# Altium footprint library PcbLib1.PcbLib: 1016 footprints (part 28 of 64)
Each footprint in its own frame and in the unit in brackets; x right, y up, seen from the top. Pads: shape width x height; smd on the part's side, far side on the other; paste and mask are expansions set on the pad; w line width, h text height; cw(c..) or ccw(c..) is an arc to the next point about the centre after c.
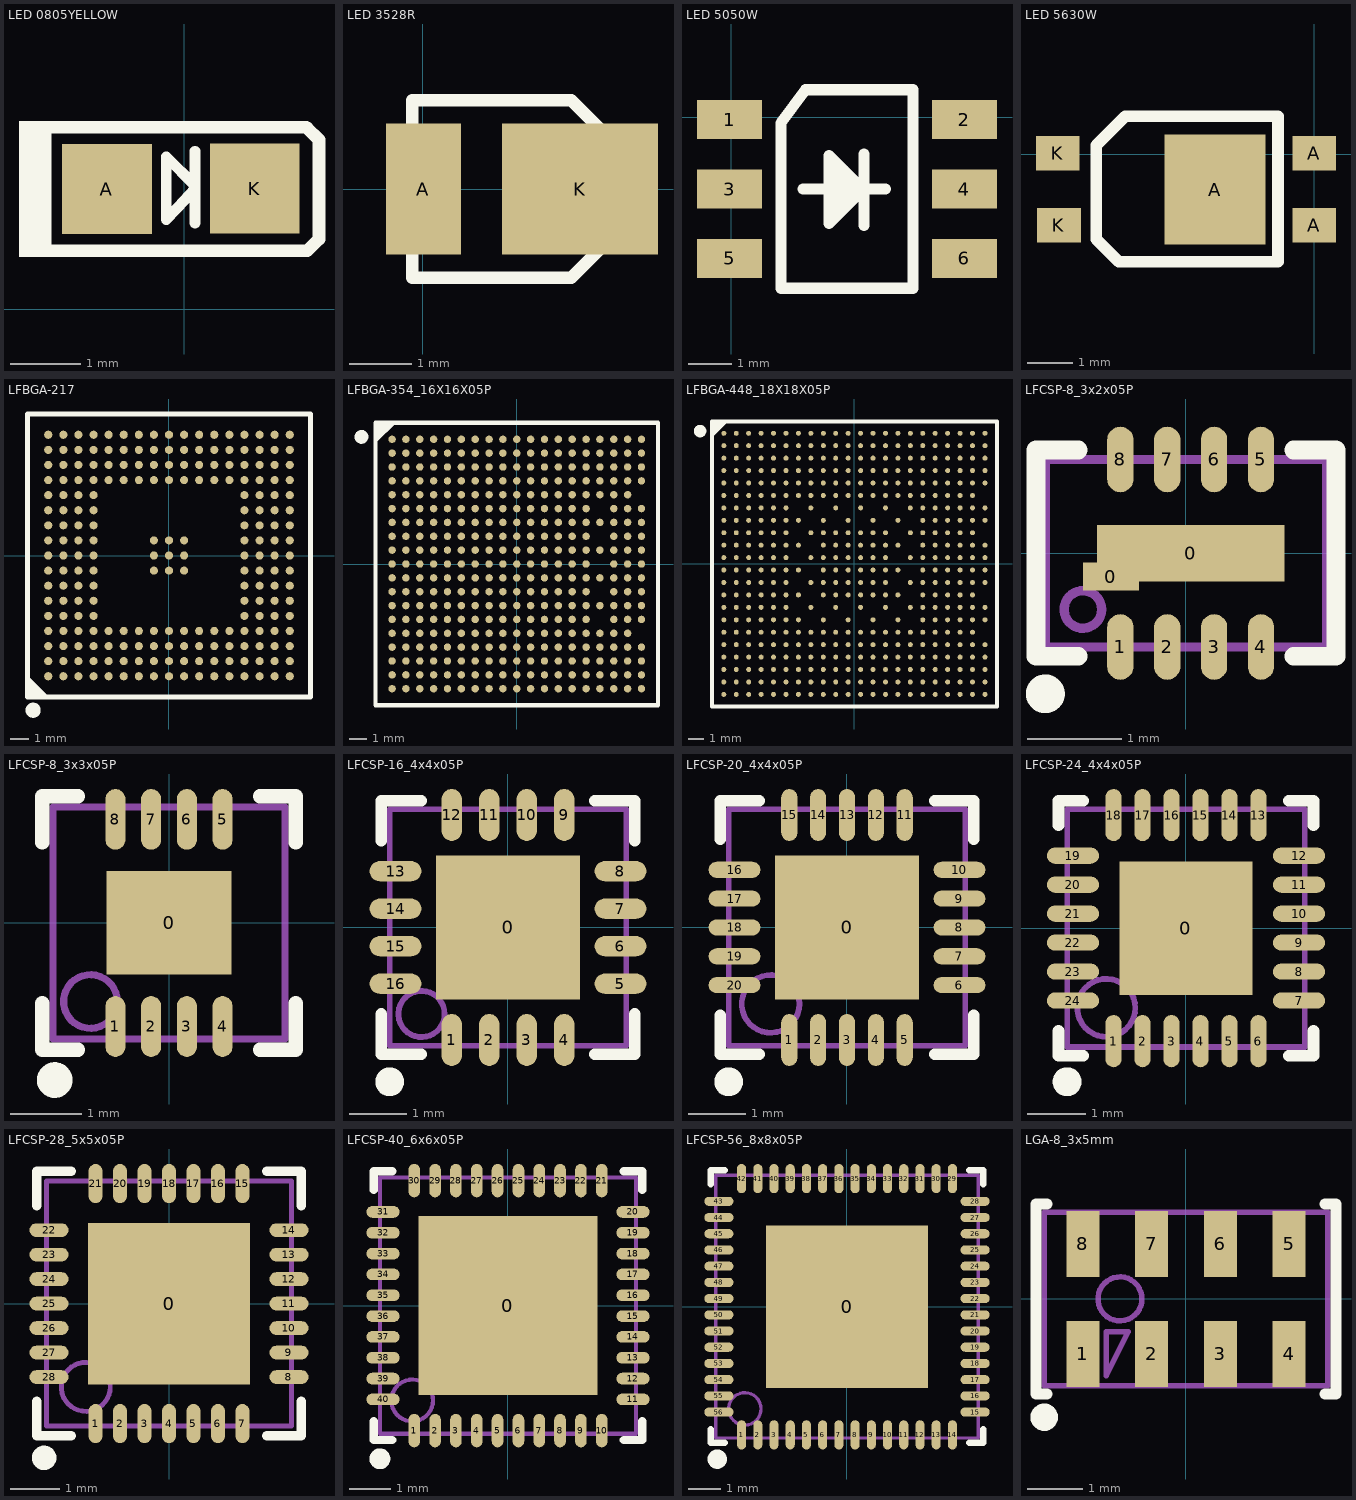
[diagram p27: the footprints below, top view; thin cyan lines are the x and y axes]

## LED 0805YELLOW [mil]
pads (2):
  rect 50x50 smd: A(-43,67) K(39.3,67.2)
Top Overlay:
  rectangle: -92,29 -74,105
  lines w6: 6,48 6,88 ; 6,67 -10,50 -10,85 6,69
  lines w7: -86,101.5 67.98,101.5 68.48,101 75.06,94.42 75.06,39.06 68.5,32.5 -81,32.5
  lines w8: -78.06,44.56 -78.06,88
3D body: height 15, standoff 0, extent 20.15,46.07 36.88,87.93
3D body: height 15, standoff 0, extent -42.41,45.96 -25.68,88.04
3D body: height 15, standoff 0, extent -25.75,46 20.31,88
3D body: height 18, standoff 0, extent -17.85,48.72 13.4,82.81
3D body: height 18, standoff 0, extent -16.53,55 4.53,77

## LED 3528R [mm]
pads (2):
  rect 1.2x2.1 smd: A(0.013,0)
  rect 2.5x2.1 smd: K(2.527,0)
Top Overlay:
  lines w0.2: -0.165,-1.422 2.388,-1.422 3.34,-0.47 3.34,0.47 2.388,1.422 -0.165,1.422 -0.165,-1.422
3D body "3.STEP": height 1.95, standoff 0.05, extent -0.254,-1.4 3.246,1.4

## LED 5050W [mm]
pads (6):
  rect 1.5x0.9 smd: 1(-0.038,-0.051) 2(5.372,-0.051) 3(-0.038,-1.651) 4(5.372,-1.651) 5(-0.038,-3.251) 6(5.372,-3.251)
Top Overlay:
  lines w0.254: 1.651,-1.651 3.556,-1.651 ; 2.413,-1.092 2.438,-2.083 2.921,-1.651 2.667,-1.397 2.667,-1.651 2.667,-1.905 ; 3.023,-1.671 2.25,-2.443 2.25,-0.876 3.063,-1.689 ; 3.063,-2.492 3.063,-0.846 ; 1.143,-3.937 4.191,-3.937 4.191,0.635 1.714,0.635 1.143,-0.127 1.143,-3.937
Mechanical 15:
  circle w0.05: c2.667,-1.651 r0.35
  lines w0.05: 2.167,-1.651 3.167,-1.651 ; 2.667,-2.151 2.667,-1.151
3D body "2.STEP": height 1.65, standoff 0.05, extent -0.033,-4.111 5.367,0.889

## LED 5630W [mm]
pads (5):
  rect 2.2x2.4 smd: A(-2.159,-0.768)
  rect 0.95x0.75 smd: A(0,-1.543) A(0,0.019) K(-5.588,0.019) K(-5.563,-1.543)
Top Overlay:
  lines w0.254: -4.75,-1.854 -4.75,0.197 -4.115,0.832 -0.787,0.832 -0.787,-2.343 -4.261,-2.343 -4.75,-1.854
3D body "1.STEP": height 0.95, standoff 0.05, extent -5.567,-2.286 0.233,0.714

## LFBGA-217 [mm]
pads (217):
  round 0.43 smd mask+0.051: A1(-6.4,-6.4) A2(-6.4,-5.6) A3(-6.4,-4.8) A4(-6.4,-4) A5(-6.4,-3.2) A6(-6.4,-2.4) A7(-6.4,-1.6) A8(-6.4,-0.8) A9(-6.4,0) A10(-6.4,0.8) A11(-6.4,1.6) A12(-6.4,2.4) A13(-6.4,3.2) A14(-6.4,4) A15(-6.4,4.8) A16(-6.4,5.6) A17(-6.4,6.4) B1(-5.6,-6.4) B2(-5.6,-5.6) B3(-5.6,-4.8) B4(-5.6,-4) B5(-5.6,-3.2) B6(-5.6,-2.4) B7(-5.6,-1.6) B8(-5.6,-0.8) B9(-5.6,0) B10(-5.6,0.8) B11(-5.6,1.6) B12(-5.6,2.4) B13(-5.6,3.2) B14(-5.6,4) B15(-5.6,4.8) B16(-5.6,5.6) B17(-5.6,6.4) C1(-4.8,-6.4) C2(-4.8,-5.6) C3(-4.8,-4.8) C4(-4.8,-4) C5(-4.8,-3.2) C6(-4.8,-2.4) C7(-4.8,-1.6) C8(-4.8,-0.8) C9(-4.8,0) C10(-4.8,0.8) C11(-4.8,1.6) C12(-4.8,2.4) C13(-4.8,3.2) C14(-4.8,4) C15(-4.8,4.8) C16(-4.8,5.6) C17(-4.8,6.4) D1(-4,-6.4) D2(-4,-5.6) D3(-4,-4.8) D4(-4,-4) D5(-4,-3.2) D6(-4,-2.4) D7(-4,-1.6) D8(-4,-0.8) D9(-4,0) D10(-4,0.8) D11(-4,1.6) D12(-4,2.4) D13(-4,3.2) D14(-4,4) D15(-4,4.8) D16(-4,5.6) D17(-4,6.4) E1(-3.2,-6.4) E2(-3.2,-5.6) E3(-3.2,-4.8) E4(-3.2,-4) E14(-3.2,4) E15(-3.2,4.8) E16(-3.2,5.6) E17(-3.2,6.4) F1(-2.4,-6.4) F2(-2.4,-5.6) F3(-2.4,-4.8) F4(-2.4,-4) F14(-2.4,4) F15(-2.4,4.8) F16(-2.4,5.6) F17(-2.4,6.4) G1(-1.6,-6.4) G2(-1.6,-5.6) G3(-1.6,-4.8) G4(-1.6,-4) G14(-1.6,4) G15(-1.6,4.8) G16(-1.6,5.6) G17(-1.6,6.4) H1(-0.8,-6.4) H2(-0.8,-5.6) H3(-0.8,-4.8) H4(-0.8,-4) H8(-0.8,-0.8) H9(-0.8,0) H10(-0.8,0.8) H14(-0.8,4) H15(-0.8,4.8) H16(-0.8,5.6) H17(-0.8,6.4) J1(0,-6.4) J2(0,-5.6) J3(0,-4.8) J4(0,-4) J8(0,-0.8) J9(0,0) J10(0,0.8) J14(0,4) J15(0,4.8) J16(0,5.6) J17(0,6.4) K1(0.8,-6.4) K2(0.8,-5.6) K3(0.8,-4.8) K4(0.8,-4) K8(0.8,-0.8) K9(0.8,0) K10(0.8,0.8) K14(0.8,4) K15(0.8,4.8) K16(0.8,5.6) K17(0.8,6.4) L1(1.6,-6.4) L2(1.6,-5.6) L3(1.6,-4.8) L4(1.6,-4) L14(1.6,4) L15(1.6,4.8) L16(1.6,5.6) L17(1.6,6.4) M1(2.4,-6.4) M2(2.4,-5.6) M3(2.4,-4.8) M4(2.4,-4) M14(2.4,4) M15(2.4,4.8) M16(2.4,5.6) M17(2.4,6.4) N1(3.2,-6.4) N2(3.2,-5.6) N3(3.2,-4.8) N4(3.2,-4) N14(3.2,4) N15(3.2,4.8) N16(3.2,5.6) N17(3.2,6.4) P1(4,-6.4) P2(4,-5.6) P3(4,-4.8) P4(4,-4) P5(4,-3.2) P6(4,-2.4) P7(4,-1.6) P8(4,-0.8) P9(4,0) P10(4,0.8) P11(4,1.6) P12(4,2.4) P13(4,3.2) P14(4,4) P15(4,4.8) P16(4,5.6) P17(4,6.4) R1(4.8,-6.4) R2(4.8,-5.6) R3(4.8,-4.8) R4(4.8,-4) R5(4.8,-3.2) R6(4.8,-2.4) R7(4.8,-1.6) R8(4.8,-0.8) R9(4.8,0) R10(4.8,0.8) R11(4.8,1.6) R12(4.8,2.4) R13(4.8,3.2) R14(4.8,4) R15(4.8,4.8) R16(4.8,5.6) R17(4.8,6.4) T1(5.6,-6.4) T2(5.6,-5.6) T3(5.6,-4.8) T4(5.6,-4) T5(5.6,-3.2) T6(5.6,-2.4) T7(5.6,-1.6) T8(5.6,-0.8) T9(5.6,0) T10(5.6,0.8) T11(5.6,1.6) T12(5.6,2.4) T13(5.6,3.2) T14(5.6,4) T15(5.6,4.8) T16(5.6,5.6) T17(5.6,6.4) U1(6.4,-6.4) U2(6.4,-5.6) U3(6.4,-4.8) U4(6.4,-4) U5(6.4,-3.2) U6(6.4,-2.4) U7(6.4,-1.6) U8(6.4,-0.8) U9(6.4,0) U10(6.4,0.8) U11(6.4,1.6) U12(6.4,2.4) U13(6.4,3.2) U14(6.4,4) U15(6.4,4.8) U16(6.4,5.6) U17(6.4,6.4)
Top Overlay:
  circle w0.4: c-7.2,-8.2 r0.2
  region: -7.5,-6.5 -6.5,-7.5 -7.5,-7.5
  lines w0.2: -7.5,-6.5 -6.5,-7.5
  lines w0.254: -7.5,-7.5 -7.5,7.5 7.5,7.5 7.5,-7.5 -7.5,-7.5
Mechanical 13:
  lines w0.1: -7.5,-7.5 -7.5,7.5 7.5,7.5 7.5,-7.5 -7.5,-7.5

## LFBGA-354_16X16X05P [mm]
pads (354):
  round 0.43 smd mask+0.051: A1(-7.2,7.2) A2(-6.4,7.2) A3(-5.6,7.2) A4(-4.8,7.2) A5(-4,7.2) A6(-3.2,7.2) A7(-2.4,7.2) A8(-1.6,7.2) A9(-0.8,7.2) A10(0,7.2) A11(0.8,7.2) A12(1.6,7.2) A13(2.4,7.2) A14(3.2,7.2) A15(4,7.2) A16(4.8,7.2) A17(5.6,7.2) A18(6.4,7.2) A19(7.2,7.2) B1(-7.2,6.4) B2(-6.4,6.4) B3(-5.6,6.4) B4(-4.8,6.4) B5(-4,6.4) B6(-3.2,6.4) B7(-2.4,6.4) B8(-1.6,6.4) B9(-0.8,6.4) B10(0,6.4) B11(0.8,6.4) B12(1.6,6.4) B13(2.4,6.4) B14(3.2,6.4) B15(4,6.4) B16(4.8,6.4) B17(5.6,6.4) B18(6.4,6.4) B19(7.2,6.4) C1(-7.2,5.6) C2(-6.4,5.6) C3(-5.6,5.6) C4(-4.8,5.6) C5(-4,5.6) C6(-3.2,5.6) C7(-2.4,5.6) C8(-1.6,5.6) C9(-0.8,5.6) C10(0,5.6) C11(0.8,5.6) C12(1.6,5.6) C13(2.4,5.6) C14(3.2,5.6) C15(4,5.6) C16(4.8,5.6) C17(5.6,5.6) C18(6.4,5.6) C19(7.2,5.6) D1(-7.2,4.8) D2(-6.4,4.8) D3(-5.6,4.8) D4(-4.8,4.8) D5(-4,4.8) D6(-3.2,4.8) D7(-2.4,4.8) D8(-1.6,4.8) D9(-0.8,4.8) D10(0,4.8) D11(0.8,4.8) D12(1.6,4.8) D13(2.4,4.8) D14(3.2,4.8) D15(4,4.8) D16(4.8,4.8) D17(5.6,4.8) D18(6.4,4.8) D19(7.2,4.8) E1(-7.2,4) E2(-6.4,4) E3(-5.6,4) E4(-4.8,4) E5(-4,4) E6(-3.2,4) E7(-2.4,4) E8(-1.6,4) E9(-0.8,4) E10(0,4) E11(0.8,4) E12(1.6,4) E13(2.4,4) E14(3.2,4) E15(4,4) E16(4.8,4) E17(5.6,4) E18(6.4,4) F1(-7.2,3.2) F2(-6.4,3.2) F3(-5.6,3.2) F4(-4.8,3.2) F5(-4,3.2) F6(-3.2,3.2) F7(-2.4,3.2) F8(-1.6,3.2) F9(-0.8,3.2) F10(0,3.2) F11(0.8,3.2) F12(1.6,3.2) F13(2.4,3.2) F14(3.2,3.2) F15(4,3.2) F17(5.6,3.2) F18(6.4,3.2) F19(7.2,3.2) G1(-7.2,2.4) G2(-6.4,2.4) G3(-5.6,2.4) G4(-4.8,2.4) G5(-4,2.4) G6(-3.2,2.4) G7(-2.4,2.4) G8(-1.6,2.4) G9(-0.8,2.4) G10(0,2.4) G11(0.8,2.4) G12(1.6,2.4) G13(2.4,2.4) G14(3.2,2.4) G15(4,2.4) G16(4.8,2.4) G17(5.6,2.4) G18(6.4,2.4) G19(7.2,2.4) H1(-7.2,1.6) H2(-6.4,1.6) H3(-5.6,1.6) H4(-4.8,1.6) H5(-4,1.6) H6(-3.2,1.6) H7(-2.4,1.6) H8(-1.6,1.6) H9(-0.8,1.6) H10(0,1.6) H11(0.8,1.6) H12(1.6,1.6) H13(2.4,1.6) H14(3.2,1.6) H15(4,1.6) H17(5.6,1.6) H18(6.4,1.6) H19(7.2,1.6) J1(-7.2,0.8) J2(-6.4,0.8) J3(-5.6,0.8) J4(-4.8,0.8) J5(-4,0.8) J6(-3.2,0.8) J7(-2.4,0.8) J8(-1.6,0.8) J9(-0.8,0.8) J10(0,0.8) J11(0.8,0.8) J12(1.6,0.8) J13(2.4,0.8) J14(3.2,0.8) J15(4,0.8) J16(4.8,0.8) J17(5.6,0.8) J18(6.4,0.8) J19(7.2,0.8) K1(-7.2,0) K2(-6.4,0) K3(-5.6,0) K4(-4.8,0) K5(-4,0) K6(-3.2,0) K7(-2.4,0) K8(-1.6,0) K9(-0.8,0) K10(0,0) K11(0.8,0) K12(1.6,0) K13(2.4,0) K14(3.2,0) K15(4,0) K17(5.6,0) K18(6.4,0) K19(7.2,0) L1(-7.2,-0.8) L2(-6.4,-0.8) L3(-5.6,-0.8) L4(-4.8,-0.8) L5(-4,-0.8) L6(-3.2,-0.8) L7(-2.4,-0.8) L8(-1.6,-0.8) L9(-0.8,-0.8) L10(0,-0.8) L11(0.8,-0.8) L12(1.6,-0.8) L13(2.4,-0.8) L14(3.2,-0.8) L15(4,-0.8) L16(4.8,-0.8) L17(5.6,-0.8) L18(6.4,-0.8) L19(7.2,-0.8) M1(-7.2,-1.6) M2(-6.4,-1.6) M3(-5.6,-1.6) M4(-4.8,-1.6) M5(-4,-1.6) M6(-3.2,-1.6) M7(-2.4,-1.6) M8(-1.6,-1.6) M9(-0.8,-1.6) M10(0,-1.6) M11(0.8,-1.6) M12(1.6,-1.6) M13(2.4,-1.6) M14(3.2,-1.6) M15(4,-1.6) M17(5.6,-1.6) M18(6.4,-1.6) M19(7.2,-1.6) N1(-7.2,-2.4) N2(-6.4,-2.4) N3(-5.6,-2.4) N4(-4.8,-2.4) N5(-4,-2.4) N6(-3.2,-2.4) N7(-2.4,-2.4) N8(-1.6,-2.4) N9(-0.8,-2.4) N10(0,-2.4) N11(0.8,-2.4) N12(1.6,-2.4) N13(2.4,-2.4) N14(3.2,-2.4) N15(4,-2.4) N16(4.8,-2.4) N17(5.6,-2.4) N18(6.4,-2.4) N19(7.2,-2.4) P1(-7.2,-3.2) P2(-6.4,-3.2) P3(-5.6,-3.2) P4(-4.8,-3.2) P5(-4,-3.2) P6(-3.2,-3.2) P7(-2.4,-3.2) P8(-1.6,-3.2) P9(-0.8,-3.2) P10(0,-3.2) P11(0.8,-3.2) P12(1.6,-3.2) P13(2.4,-3.2) P14(3.2,-3.2) P15(4,-3.2) P17(5.6,-3.2) P18(6.4,-3.2) P19(7.2,-3.2) R1(-7.2,-4) R2(-6.4,-4) R3(-5.6,-4) R4(-4.8,-4) R5(-4,-4) R6(-3.2,-4) R7(-2.4,-4) R8(-1.6,-4) R9(-0.8,-4) R10(0,-4) R11(0.8,-4) R12(1.6,-4) R13(2.4,-4) R14(3.2,-4) R15(4,-4) R16(4.8,-4) R17(5.6,-4) R18(6.4,-4) T1(-7.2,-4.8) T2(-6.4,-4.8) T3(-5.6,-4.8) T4(-4.8,-4.8) T5(-4,-4.8) T6(-3.2,-4.8) T7(-2.4,-4.8) T8(-1.6,-4.8) T9(-0.8,-4.8) T10(0,-4.8) T11(0.8,-4.8) T12(1.6,-4.8) T13(2.4,-4.8) T14(3.2,-4.8) T15(4,-4.8) T16(4.8,-4.8) T17(5.6,-4.8) T18(6.4,-4.8) T19(7.2,-4.8) U1(-7.2,-5.6) U2(-6.4,-5.6) U3(-5.6,-5.6) U4(-4.8,-5.6) U5(-4,-5.6) U6(-3.2,-5.6) U7(-2.4,-5.6) U8(-1.6,-5.6) U9(-0.8,-5.6) U10(0,-5.6) U11(0.8,-5.6) U12(1.6,-5.6) U13(2.4,-5.6) U14(3.2,-5.6) U15(4,-5.6) U16(4.8,-5.6) U17(5.6,-5.6) U18(6.4,-5.6) U19(7.2,-5.6) V1(-7.2,-6.4) V2(-6.4,-6.4) V3(-5.6,-6.4) V4(-4.8,-6.4) V5(-4,-6.4) V6(-3.2,-6.4) V7(-2.4,-6.4) V8(-1.6,-6.4) V9(-0.8,-6.4) V10(0,-6.4) V11(0.8,-6.4) V12(1.6,-6.4) V13(2.4,-6.4) V14(3.2,-6.4) V15(4,-6.4) V16(4.8,-6.4) V17(5.6,-6.4) V18(6.4,-6.4) V19(7.2,-6.4) W1(-7.2,-7.2) W2(-6.4,-7.2) W3(-5.6,-7.2) W4(-4.8,-7.2) W5(-4,-7.2) W6(-3.2,-7.2) W7(-2.4,-7.2) W8(-1.6,-7.2) W9(-0.8,-7.2) W10(0,-7.2) W11(0.8,-7.2) W12(1.6,-7.2) W13(2.4,-7.2) W14(3.2,-7.2) W15(4,-7.2) W16(4.8,-7.2) W17(5.6,-7.2) W18(6.4,-7.2) W19(7.2,-7.2)
Top Overlay:
  circle w0.4: c-8.966,7.341 r0.2
  region: -7.11,8.135 -8.11,7.135 -8.11,8.135
  lines w0.2: -8.11,7.135 -7.11,8.135
  lines w0.254: -8.153,-8.153 8.153,-8.153 8.153,8.153 -8.153,8.153 -8.153,-8.153
Mechanical 13:
  lines w0.1: -8.153,-8.153 -8.153,8.128 8.153,8.128 8.153,-8.153 -8.153,-8.153
3D body "LFBGA354_16X16.step": height 1.3, standoff 0, extent -8.001,-8.001 8.001,8.001

## LFBGA-448_18X18X05P [mm]
pads (448):
  round 0.32 smd mask+0.05: A1(-8.381,8.394) A2(-7.581,8.394) A3(-6.781,8.394) A4(-5.981,8.394) A5(-5.181,8.394) A6(-4.381,8.394) A7(-3.581,8.394) A8(-2.781,8.394) A9(-1.981,8.394) A10(-1.181,8.394) A11(-0.381,8.394) A12(0.419,8.394) A13(1.219,8.394) A14(2.019,8.394) A15(2.819,8.394) A16(3.619,8.394) A17(4.419,8.394) A18(5.219,8.394) A19(6.019,8.394) A20(6.819,8.394) A21(7.619,8.394) A22(8.419,8.394) AA1(-8.381,-7.606) AA2(-7.581,-7.606) AA3(-6.781,-7.606) AA4(-5.981,-7.606) AA5(-5.181,-7.606) AA6(-4.381,-7.606) AA7(-3.581,-7.606) AA8(-2.781,-7.606) AA9(-1.981,-7.606) AA10(-1.181,-7.606) AA11(-0.381,-7.606) AA12(0.419,-7.606) AA13(1.219,-7.606) AA14(2.019,-7.606) AA15(2.819,-7.606) AA16(3.619,-7.606) AA17(4.419,-7.606) AA18(5.219,-7.606) AA19(6.019,-7.606) AA20(6.819,-7.606) AA21(7.619,-7.606) AA22(8.419,-7.606) AB1(-8.381,-8.406) AB2(-7.581,-8.406) AB3(-6.781,-8.406) AB4(-5.981,-8.406) AB5(-5.181,-8.406) AB6(-4.381,-8.406) AB7(-3.581,-8.406) AB8(-2.781,-8.406) AB9(-1.981,-8.406) AB10(-1.181,-8.406) AB11(-0.381,-8.406) AB12(0.419,-8.406) AB13(1.219,-8.406) AB14(2.019,-8.406) AB15(2.819,-8.406) AB16(3.619,-8.406) AB17(4.419,-8.406) AB18(5.219,-8.406) AB19(6.019,-8.406) AB20(6.819,-8.406) AB21(7.619,-8.406) AB22(8.419,-8.406) B1(-8.381,7.594) B2(-7.581,7.594) B3(-6.781,7.594) B4(-5.981,7.594) B5(-5.181,7.594) B6(-4.381,7.594) B7(-3.581,7.594) B8(-2.781,7.594) B9(-1.981,7.594) B10(-1.181,7.594) B11(-0.381,7.594) B12(0.419,7.594) B13(1.219,7.594) B14(2.019,7.594) B15(2.819,7.594) B16(3.619,7.594) B17(4.419,7.594) B18(5.219,7.594) B19(6.019,7.594) B20(6.819,7.594) B21(7.619,7.594) B22(8.419,7.594) C1(-8.381,6.794) C2(-7.581,6.794) C3(-6.781,6.794) C4(-5.981,6.794) C5(-5.181,6.794) C6(-4.381,6.794) C7(-3.581,6.794) C8(-2.781,6.794) C9(-1.981,6.794) C10(-1.181,6.794) C11(-0.381,6.794) C12(0.419,6.794) C13(1.219,6.794) C14(2.019,6.794) C15(2.819,6.794) C16(3.619,6.794) C17(4.419,6.794) C18(5.219,6.794) C19(6.019,6.794) C20(6.819,6.794) C21(7.619,6.794) C22(8.419,6.794) D1(-8.381,5.994) D2(-7.581,5.994) D3(-6.781,5.994) D4(-5.981,5.994) D5(-5.181,5.994) D6(-4.381,5.994) D7(-3.581,5.994) D8(-2.781,5.994) D9(-1.981,5.994) D10(-1.181,5.994) D11(-0.381,5.994) D12(0.419,5.994) D13(1.219,5.994) D14(2.019,5.994) D15(2.819,5.994) D16(3.619,5.994) D17(4.419,5.994) D18(5.219,5.994) D19(6.019,5.994) D20(6.819,5.994) D21(7.619,5.994) D22(8.419,5.994) E1(-8.381,5.194) E2(-7.581,5.194) E3(-6.781,5.194) E4(-5.981,5.194) E5(-5.181,5.194) E6(-4.381,5.194) E7(-3.581,5.194) E8(-2.781,5.194) E9(-1.981,5.194) E10(-1.181,5.194) E11(-0.381,5.194) E12(0.419,5.194) E13(1.219,5.194) E14(2.019,5.194) E15(2.819,5.194) E16(3.619,5.194) E17(4.419,5.194) E18(5.219,5.194) E19(6.019,5.194) E20(6.819,5.194) E21(7.619,5.194) E22(8.419,5.194) F1(-8.381,4.394) F2(-7.581,4.394) F3(-6.781,4.394) F4(-5.981,4.394) F5(-5.181,4.394) F6(-4.381,4.394) F7(-3.581,4.394) F8(-2.781,4.394) F9(-1.981,4.394) F10(-1.181,4.394) F11(-0.381,4.394) F12(0.419,4.394) F13(1.219,4.394) F14(2.019,4.394) F15(2.819,4.394) F16(3.619,4.394) F17(4.419,4.394) F18(5.219,4.394) F19(6.019,4.394) F20(6.819,4.394) F21(7.619,4.394) G1(-8.381,3.594) G2(-7.581,3.594) G3(-6.781,3.594) G4(-5.981,3.594) G5(-5.181,3.594) G6(-4.381,3.594) G8(-2.781,3.594) G10(-1.181,3.594) G12(0.419,3.594) G14(2.019,3.594) G16(3.619,3.594) G17(4.419,3.594) G18(5.219,3.594) G19(6.019,3.594) G20(6.819,3.594) G21(7.619,3.594) G22(8.419,3.594) H1(-8.381,2.794) H2(-7.581,2.794) H3(-6.781,2.794) H4(-5.981,2.794) H5(-5.181,2.794) H6(-4.381,2.794) H7(-3.581,2.794) H9(-1.981,2.794) H11(-0.381,2.794) H13(1.219,2.794) H15(2.819,2.794) H17(4.419,2.794) H18(5.219,2.794) H19(6.019,2.794) H20(6.819,2.794) H21(7.619,2.794) H22(8.419,2.794) J1(-8.381,1.994) J2(-7.581,1.994) J3(-6.781,1.994) J4(-5.981,1.994) J5(-5.181,1.994) J6(-4.381,1.994) J8(-2.781,1.994) J9(-1.981,1.994) J10(-1.181,1.994) J11(-0.381,1.994) J12(0.419,1.994) J13(1.219,1.994) J14(2.019,1.994) J16(3.619,1.994) J17(4.419,1.994) J18(5.219,1.994) J19(6.019,1.994) J20(6.819,1.994) J21(7.619,1.994) K1(-8.381,1.194) K2(-7.581,1.194) K3(-6.781,1.194) K4(-5.981,1.194) K5(-5.181,1.194) K6(-4.381,1.194) K7(-3.581,1.194) K9(-1.981,1.194) K10(-1.181,1.194) K11(-0.381,1.194) K12(0.419,1.194) K13(1.219,1.194) K14(2.019,1.194) K15(2.819,1.194) K17(4.419,1.194) K18(5.219,1.194) K19(6.019,1.194) K20(6.819,1.194) K21(7.619,1.194) K22(8.419,1.194) L1(-8.381,0.394) L2(-7.581,0.394) L3(-6.781,0.394) L4(-5.981,0.394) L5(-5.181,0.394) L6(-4.381,0.394) L8(-2.781,0.394) L9(-1.981,0.394) L10(-1.181,0.394) L11(-0.381,0.394) L12(0.419,0.394) L13(1.219,0.394) L14(2.019,0.394) L16(3.619,0.394) L17(4.419,0.394) L18(5.219,0.394) L19(6.019,0.394) L20(6.819,0.394) L21(7.619,0.394) L22(8.419,0.394) M1(-8.381,-0.406) M2(-7.581,-0.406) M3(-6.781,-0.406) M4(-5.981,-0.406) M5(-5.181,-0.406) M6(-4.381,-0.406) M7(-3.581,-0.406) M9(-1.981,-0.406) M10(-1.181,-0.406) M11(-0.381,-0.406) M12(0.419,-0.406) M13(1.219,-0.406) M14(2.019,-0.406) M15(2.819,-0.406) M17(4.419,-0.406) M18(5.219,-0.406) M19(6.019,-0.406) M20(6.819,-0.406) M21(7.619,-0.406) M22(8.419,-0.406) N1(-8.381,-1.206) N2(-7.581,-1.206) N3(-6.781,-1.206) N4(-5.981,-1.206) N5(-5.181,-1.206) N6(-4.381,-1.206) N8(-2.781,-1.206) N9(-1.981,-1.206) N10(-1.181,-1.206) N11(-0.381,-1.206) N12(0.419,-1.206) N13(1.219,-1.206) N14(2.019,-1.206) N16(3.619,-1.206) N17(4.419,-1.206) N18(5.219,-1.206) N19(6.019,-1.206) N20(6.819,-1.206) N21(7.619,-1.206) N22(8.419,-1.206) P1(-8.381,-2.006) P2(-7.581,-2.006) P3(-6.781,-2.006) P4(-5.981,-2.006) P5(-5.181,-2.006) P6(-4.381,-2.006) P7(-3.581,-2.006) P9(-1.981,-2.006) P10(-1.181,-2.006) P11(-0.381,-2.006) P12(0.419,-2.006) P13(1.219,-2.006) P14(2.019,-2.006) P15(2.819,-2.006) P17(4.419,-2.006) P18(5.219,-2.006) P19(6.019,-2.006) P20(6.819,-2.006) P21(7.619,-2.006) R1(-8.381,-2.806) R2(-7.581,-2.806) R3(-6.781,-2.806) R4(-5.981,-2.806) R5(-5.181,-2.806) R6(-4.381,-2.806) R8(-2.781,-2.806) R10(-1.181,-2.806) R12(0.419,-2.806) R14(2.019,-2.806) R16(3.619,-2.806) R17(4.419,-2.806) R18(5.219,-2.806) R19(6.019,-2.806) R20(6.819,-2.806) R21(7.619,-2.806) R22(8.419,-2.806) T1(-8.381,-3.606) T2(-7.581,-3.606) T3(-6.781,-3.606) T4(-5.981,-3.606) T5(-5.181,-3.606) T6(-4.381,-3.606) T7(-3.581,-3.606) T9(-1.981,-3.606) T11(-0.381,-3.606) T13(1.219,-3.606) T15(2.819,-3.606) T17(4.419,-3.606) T18(5.219,-3.606) T19(6.019,-3.606) T20(6.819,-3.606) T21(7.619,-3.606) T22(8.419,-3.606) U1(-8.381,-4.406) U2(-7.581,-4.406) U3(-6.781,-4.406) U4(-5.981,-4.406) U5(-5.181,-4.406) U6(-4.381,-4.406) U7(-3.581,-4.406) U8(-2.781,-4.406) U9(-1.981,-4.406) U10(-1.181,-4.406) U11(-0.381,-4.406) U12(0.419,-4.406) U13(1.219,-4.406) U14(2.019,-4.406) U15(2.819,-4.406) U16(3.619,-4.406) U17(4.419,-4.406) U18(5.219,-4.406) U19(6.019,-4.406) U20(6.819,-4.406) U21(7.619,-4.406) V1(-8.381,-5.206) V2(-7.581,-5.206) V3(-6.781,-5.206) V4(-5.981,-5.206) V5(-5.181,-5.206) V6(-4.381,-5.206) V7(-3.581,-5.206) V8(-2.781,-5.206) V9(-1.981,-5.206) V10(-1.181,-5.206) V11(-0.381,-5.206) V12(0.419,-5.206) V13(1.219,-5.206) V14(2.019,-5.206) V15(2.819,-5.206) V16(3.619,-5.206) V17(4.419,-5.206) V18(5.219,-5.206) V19(6.019,-5.206) V20(6.819,-5.206) V21(7.619,-5.206) V22(8.419,-5.206) W1(-8.381,-6.006) W2(-7.581,-6.006) W3(-6.781,-6.006) W4(-5.981,-6.006) W5(-5.181,-6.006) W6(-4.381,-6.006) W7(-3.581,-6.006) W8(-2.781,-6.006) W9(-1.981,-6.006) W10(-1.181,-6.006) W11(-0.381,-6.006) W12(0.419,-6.006) W13(1.219,-6.006) W14(2.019,-6.006) W15(2.819,-6.006) W16(3.619,-6.006) W17(4.419,-6.006) W18(5.219,-6.006) W19(6.019,-6.006) W20(6.819,-6.006) W21(7.619,-6.006) W22(8.419,-6.006) Y1(-8.381,-6.806) Y2(-7.581,-6.806) Y3(-6.781,-6.806) Y4(-5.981,-6.806) Y5(-5.181,-6.806) Y6(-4.381,-6.806) Y7(-3.581,-6.806) Y8(-2.781,-6.806) Y9(-1.981,-6.806) Y10(-1.181,-6.806) Y11(-0.381,-6.806) Y12(0.419,-6.806) Y13(1.219,-6.806) Y14(2.019,-6.806) Y15(2.819,-6.806) Y16(3.619,-6.806) Y17(4.419,-6.806) Y18(5.219,-6.806) Y19(6.019,-6.806) Y20(6.819,-6.806) Y21(7.619,-6.806) Y22(8.419,-6.806)
Top Overlay:
  circle w0.4: c-9.906,8.534 r0.2
  region: -8.161,9.161 -9.161,8.161 -9.161,9.161
  lines w0.2: -9.157,8.217 -8.217,9.157
  lines w0.254: -9.144,-9.195 9.195,-9.195 9.195,9.144 -9.144,9.144 -9.144,-9.195
Mechanical 13:
  lines w0.1: -9.144,-9.195 9.195,-9.195 9.195,9.144 -9.144,9.144 -9.144,-9.195
3D body "LFBGA448_18X18-001.step": height 1.56, standoff 0.01, extent -8.979,-9.029 9.03,8.979

## LFCSP-8_3x2x05P [mm]
pads (10):
  rect 0.6x0.3 smd mask+0.051: 0(-0.8,-0.25)
  rect 2x0.6 smd mask+0.051: 0(0.05,0)
  oval 0.28x0.7 smd mask+0.051: 1(-0.7,-1) 2(-0.2,-1) 3(0.3,-1) 4(0.8,-1) 5(0.8,1) 6(0.3,1) 7(-0.2,1) 8(-0.7,1)
Top Overlay:
  circle w0.254: c-1.5,-1.5 r0.08
  lines w0.2: -1.15,-1.1 -1.6,-1.1 -1.6,1.1 -1.15,1.1 ; 1.15,-1.1 1.6,-1.1 1.6,1.1 1.15,1.1
Mechanical 13:
  circle w0.1: c-1.1,-0.6 r0.2
  lines w0.1: -1.5,-1 1.5,-1 1.5,1 -1.5,1 -1.5,-1

## LFCSP-8_3x3x05P [mm]
pads (9):
  rect 1.75x1.45 smd mask+0.051: 0(0,0)
  oval 0.28x0.85 smd mask+0.051: 1(-0.75,-1.45) 2(-0.25,-1.45) 3(0.25,-1.45) 4(0.75,-1.45) 5(0.75,1.45) 6(0.25,1.45) 7(-0.25,1.45) 8(-0.75,1.45)
Top Overlay:
  circle w0.25: c-1.6,-2.2 r0.125
  lines w0.2: -1.775,-1.125 -1.775,-1.775 -1.275,-1.775 ; -1.775,1.125 -1.775,1.775 -1.275,1.775 ; 1.275,-1.775 1.775,-1.775 1.775,-1.125 ; 1.275,1.775 1.775,1.775 1.775,1.125
Mechanical 13:
  circle w0.1: c-1.1,-1.1 r0.376
  lines w0.1: -1.625,-1.625 -1.625,1.625 1.625,1.625 1.625,-1.625 -1.625,-1.625

## LFCSP-16_4x4x05P [mm]
pads (18):
  rect 2.5x2.5 smd paste-1.225 mask+0.051: 0(0,0)
  oval 0.35x0.9 smd mask+0.051: 1(-0.975,-1.95) 2(-0.325,-1.95) 3(0.325,-1.95) 4(0.975,-1.95) 9(0.975,1.95) 10(0.325,1.95) 11(-0.325,1.95) 12(-0.975,1.95)
  oval 0.9x0.35 smd mask+0.051: 5(1.95,-0.975) 6(1.95,-0.325) 7(1.95,0.325) 8(1.95,0.975) 13(-1.95,0.975) 14(-1.95,0.325) 15(-1.95,-0.325) 16(-1.95,-0.975)
  rect 2.5x2.5 smd mask+0.051: ""(0,0)
Top Overlay:
  circle w0.25: c-2.05,-2.675 r0.125
  lines w0.2: -2.2,-1.5 -2.2,-2.2 -1.5,-2.2 ; -2.2,1.5 -2.2,2.2 -1.5,2.2 ; 1.5,-2.2 2.2,-2.2 2.2,-1.5 ; 1.5,2.2 2.2,2.2 2.2,1.5
Mechanical 13:
  circle w0.1: c-1.5,-1.5 r0.4
  lines w0.1: -2.05,-2.05 -2.05,2.05 2.05,2.05 2.05,-2.05 -2.05,-2.05

## LFCSP-20_4x4x05P [mm]
pads (21):
  rect 2.5x2.5 smd mask+0.051: 0(0,0)
  oval 0.28x0.9 smd mask+0.051: 1(-1,-1.95) 2(-0.5,-1.95) 3(0,-1.95) 4(0.5,-1.95) 5(1,-1.95) 11(1,1.95) 12(0.5,1.95) 13(0,1.95) 14(-0.5,1.95) 15(-1,1.95)
  oval 0.9x0.28 smd mask+0.051: 6(1.95,-1) 7(1.95,-0.5) 8(1.95,0) 9(1.95,0.5) 10(1.95,1) 16(-1.95,1) 17(-1.95,0.5) 18(-1.95,0) 19(-1.95,-0.5) 20(-1.95,-1)
Top Overlay:
  circle w0.25: c-2.05,-2.675 r0.125
  lines w0.2: -2.2,-1.525 -2.2,-2.2 -1.525,-2.2 ; -2.2,1.525 -2.2,2.2 -1.525,2.2 ; 1.525,-2.2 2.2,-2.2 2.2,-1.525 ; 1.525,2.2 2.2,2.2 2.2,1.525
Mechanical 13:
  circle w0.1: c-1.325,-1.325 r0.5
  lines w0.1: -2.05,-2.05 2.05,-2.05 2.05,2.05 -2.05,2.05 -2.05,-2.05

## LFCSP-24_4x4x05P [mm]
pads (26):
  rect 2.3x2.3 smd paste-1.05 mask+0.051: 0(0,0)
  oval 0.28x0.9 smd mask+0.051: 1(-1.25,-1.95) 2(-0.75,-1.95) 3(-0.25,-1.95) 4(0.25,-1.95) 5(0.75,-1.95) 6(1.25,-1.95) 13(1.25,1.95) 14(0.75,1.95) 15(0.25,1.95) 16(-0.25,1.95) 17(-0.75,1.95) 18(-1.25,1.95)
  oval 0.9x0.28 smd mask+0.051: 7(1.95,-1.25) 8(1.95,-0.75) 9(1.95,-0.25) 10(1.95,0.25) 11(1.95,0.75) 12(1.95,1.25) 19(-1.95,1.25) 20(-1.95,0.75) 21(-1.95,0.25) 22(-1.95,-0.25) 23(-1.95,-0.75) 24(-1.95,-1.25)
  rect 2.3x2.3 smd mask+0.051: ""(0,0)
Top Overlay:
  circle w0.25: c-2.05,-2.65 r0.125
  lines w0.2: -2.2,-1.775 -2.2,-2.2 -1.775,-2.2 ; -2.2,1.775 -2.2,2.2 -1.775,2.2 ; 1.775,-2.2 2.2,-2.2 2.2,-1.775 ; 1.775,2.2 2.2,2.2 2.2,1.775
Mechanical 13:
  circle w0.1: c-1.375,-1.375 r0.5
  lines w0.1: -2.05,-2.05 2.05,-2.05 2.05,2.05 -2.05,2.05 -2.05,-2.05

## LFCSP-28_5x5x05P [mm]
pads (29):
  rect 3.3x3.3 smd mask+0.051: 0(0,0)
  oval 0.28x0.8 smd mask+0.051: 1(-1.5,-2.45) 2(-1,-2.45) 3(-0.5,-2.45) 4(0,-2.45) 5(0.5,-2.45) 6(1,-2.45) 7(1.5,-2.45) 15(1.5,2.45) 16(1,2.45) 17(0.5,2.45) 18(0,2.45) 19(-0.5,2.45) 20(-1,2.45) 21(-1.5,2.45)
  oval 0.8x0.28 smd mask+0.051: 8(2.45,-1.5) 9(2.45,-1) 10(2.45,-0.5) 11(2.45,0) 12(2.45,0.5) 13(2.45,1) 14(2.45,1.5) 22(-2.45,1.5) 23(-2.45,1) 24(-2.45,0.5) 25(-2.45,0) 26(-2.45,-0.5) 27(-2.45,-1) 28(-2.45,-1.5)
Top Overlay:
  circle w0.25: c-2.55,-3.15 r0.125
  lines w0.2: -2.7,-2 -2.7,-2.7 -2,-2.7 ; -2.7,2 -2.7,2.7 -2,2.7 ; 2,-2.7 2.7,-2.7 2.7,-2 ; 2,2.7 2.7,2.7 2.7,2
Mechanical 13:
  circle w0.1: c-1.7,-1.7 r0.5
  lines w0.1: -2.5,-2.5 -2.5,2.5 2.5,2.5 2.5,-2.5 -2.5,-2.5

## LFCSP-40_6x6x05P [mm]
pads (41):
  rect 4.3x4.3 smd mask+0.051: 0(0,0)
  oval 0.28x0.8 smd mask+0.051: 1(-2.25,-3) 2(-1.75,-3) 3(-1.25,-3) 4(-0.75,-3) 5(-0.25,-3) 6(0.25,-3) 7(0.75,-3) 8(1.25,-3) 9(1.75,-3) 10(2.25,-3) 21(2.25,3) 22(1.75,3) 23(1.25,3) 24(0.75,3) 25(0.25,3) 26(-0.25,3) 27(-0.75,3) 28(-1.25,3) 29(-1.75,3) 30(-2.25,3)
  oval 0.8x0.28 smd mask+0.051: 11(3,-2.25) 12(3,-1.75) 13(3,-1.25) 14(3,-0.75) 15(3,-0.25) 16(3,0.25) 17(3,0.75) 18(3,1.25) 19(3,1.75) 20(3,2.25) 31(-3,2.25) 32(-3,1.75) 33(-3,1.25) 34(-3,0.75) 35(-3,0.25) 36(-3,-0.25) 37(-3,-0.75) 38(-3,-1.25) 39(-3,-1.75) 40(-3,-2.25)
Top Overlay:
  circle w0.25: c-3.075,-3.675 r0.125
  lines w0.2: -3.225,-2.775 -3.225,-3.225 -2.775,-3.225 ; -3.225,2.775 -3.225,3.225 -2.775,3.225 ; 2.775,-3.225 3.225,-3.225 3.225,-2.775 ; 2.775,3.225 3.225,3.225 3.225,2.775
Mechanical 13:
  circle w0.1: c-2.3,-2.275 r0.5
  lines w0.1: -3.075,-3.075 -3.075,3.075 3.075,3.075 3.075,-3.075 -3.075,-3.075

## LFCSP-56_8x8x05P [mm]
pads (57):
  rect 5x5 smd mask+0.051: 0(0,0)
  oval 0.28x0.9 smd mask+0.051: 1(-3.25,-3.95) 2(-2.75,-3.95) 3(-2.25,-3.95) 4(-1.75,-3.95) 5(-1.25,-3.95) 6(-0.75,-3.95) 7(-0.25,-3.95) 8(0.25,-3.95) 9(0.75,-3.95) 10(1.25,-3.95) 11(1.75,-3.95) 12(2.25,-3.95) 13(2.75,-3.95) 14(3.25,-3.95) 29(3.25,3.95) 30(2.75,3.95) 31(2.25,3.95) 32(1.75,3.95) 33(1.25,3.95) 34(0.75,3.95) 35(0.25,3.95) 36(-0.25,3.95) 37(-0.75,3.95) 38(-1.25,3.95) 39(-1.75,3.95) 40(-2.25,3.95) 41(-2.75,3.95) 42(-3.25,3.95)
  oval 0.9x0.28 smd mask+0.051: 15(3.95,-3.25) 16(3.95,-2.75) 17(3.95,-2.25) 18(3.95,-1.75) 19(3.95,-1.25) 20(3.95,-0.75) 21(3.95,-0.25) 22(3.95,0.25) 23(3.95,0.75) 24(3.95,1.25) 25(3.95,1.75) 26(3.95,2.25) 27(3.95,2.75) 28(3.95,3.25) 43(-3.95,3.25) 44(-3.95,2.75) 45(-3.95,2.25) 46(-3.95,1.75) 47(-3.95,1.25) 48(-3.95,0.75) 49(-3.95,0.25) 50(-3.95,-0.25) 51(-3.95,-0.75) 52(-3.95,-1.25) 53(-3.95,-1.75) 54(-3.95,-2.25) 55(-3.95,-2.75) 56(-3.95,-3.25)
Top Overlay:
  circle w0.3: c-4,-4.7 r0.15
  lines w0.2: -4.2,-3.775 -4.2,-4.2 -3.775,-4.2 ; -4.2,3.775 -4.2,4.2 -3.775,4.2 ; 3.775,-4.2 4.2,-4.2 4.2,-3.775 ; 3.775,4.2 4.2,4.2 4.2,3.775
Mechanical 13:
  circle w0.1: c-3.15,-3.15 r0.5
  lines w0.1: -4.05,-4.05 -4.05,4.05 4.05,4.05 4.05,-4.05 -4.05,-4.05

## LGA-8_3x5mm [mm]
pads (8):
  rect 0.6x1.2 smd: 1(-1.875,-1) 2(-0.625,-1) 3(0.625,-1) 4(1.875,-1) 5(1.875,1) 6(0.625,1) 7(-0.625,1) 8(-1.875,1)
Top Overlay:
  circle w0.25: c-2.575,-2.15 r0.125
  lines w0.2: -2.525,-1.725 -2.725,-1.725 -2.725,1.725 -2.525,1.725 ; 2.525,-1.725 2.725,-1.725 2.725,1.725 2.525,1.725
Mechanical 13:
  circle w0.1: c-1.2,0 r0.4
  lines w0.1: -2.575,-1.575 2.575,-1.575 2.575,1.575 -2.575,1.575 -2.575,-1.575 ; -1.45,-1.4 -1.45,-0.6 -1.05,-0.6 -1.45,-1.4